# Altium schematic symbol library altera.SCHLIB: 68 symbols (part 1 of 6) (continued)
## EPF10K30*-FBGA256
designator IC?, comment EPF10K30   FLEX 10K family
MPN: EPF10K30EFC256-3N; MPN: EPF10K30AQC240-3N; OC_FARNELL: 1549394; OC_NEWARK: 51R8977; OC_FARNELL: 1549384; OC_NEWARK: 51R8956
footprint FBGA256
part A pins: A1 DATA0, A9 GCLK1, B1 /CE, B2 DCLK, B9 IN3, B15 TCK, B16 /CEO, C2 TDI, C15 CONF_DONE, C16 TDO, E8 IN2, L8 GCLK0, M9 IN0, N4 /CONFIG, P1 MSEL0, P15 TMS, R1 MSEL1, R8 IN1, R16 TRST, T16 /STATUS
part B pins: C1 IOA9, D2 IOA8, D3 IOA10, D15 IOA4, D16 IOA3, E1 IOA6, E13 IOA1, E14 IOA2, E15 IOA5, F3 IOA11, F4 IOA7, F13 IOA12
part C pins: E2 IOB10, F1 IOB8, F2 IOB7, F14 IOB1, F15 IOB4, F16 IOB11, G4 IOB6, G5 IOB9, G12 IOB2, G13 IOB3, H5 IOB5
part D pins: G1 IOC11, G2 IOC10, G14 IOC1, G15 IOC3, G16 IOC4, H2 IOC7, H3 IOC8, H4 IOC9, H12 IOC2, H13 IOC12, H14 IOC5, J5 IOC6
part E pins: H15 IOD1, J2 IOD9, J3 IOD10, J4 IOD11, J12 IOD2, J13 IOD3, J14 IOD4, J15 IOD6, J16 IOD5, K1 IOD8, K4 IOD12, K12 IOD7
part F pins: K2 IOE10, K5 IOE9, K13 IOE2, K15 IOE1, L1 IOE8, L3 IOE11, L13 IOE6, L14 IOE3, L15 IOE4, L16 IOE5, M2 IOE7
part G pins: M1 IOF10, M3 IOF11, M4 IOF9, M13 IOF2, M15 IOF1, N1 IOF6, N2 IOF8, N3 IOF7, N13 IOF12, N14 IOF3, N16 IOF4, P2 IOF5
part H pins: A2 IO22, A3 IO42, A4 IO52, B3 IO12, B4 IO43, C3 IO32, C4 IO62, D4 IO63, N5 IO71, P3 IO31, P4 IO51, R3 IO41, T1 IO11, T2 IO23, T3 IO21, T4 IO61
part I pins: A5 IO82, A6 IO123, B5 IO72, B6 IO112, C5 IO93, C6 IO122, D5 IO102, E4 IO113, N6 IO101, P5 IO81, P6 IO111, R4 IO73, R5 IO103, R6 IO121, T5 IO91, T6 IO124
part J pins: A7 IO143, A8 IO173, B7 IO144, B8 IO172, C7 IO153, D6 IO132, D7 IO152, D8 IO181, E7 IO162, M7 IO133, M8 IO161, N7 IO131, N8 IO171, P7 IO142, R7 IO151, T7 IO141
part K pins: A10 IO212, B10 IO223, C8 IO182, C9 IO192, C10 IO222, D9 IO204, E9 IO203, N9 IO201, N10 IO231, P8 IO183, P9 IO202, P10 IO213, R9 IO193, R10 IO211, T9 IO191, T10 IO221
part L pins: A11 IO242, A12 IO273, B11 IO252, B12 IO282, C11 IO264, C12 IO283, D10 IO233, D11 IO263, E10 IO232, M10 IO241, N11 IO261, P11 IO262, P12 IO281, R11 IO253, R12 IO271, T11 IO251
part M pins: A13 IO302, A14 IO342, B13 IO312, B14 IO343, C13 IO292, C14 IO332, D13 IO323, D14 IO322, P13 IO301, P14 IO293, R13 IO321, R14 IO331, T12 IO291, T13 IO311, T14 IO341, T15 IO351
part N pins: A15 IO352, A16 IO362, P16 IO363, R15 IO361
part O pins: E5 GND (power)
part P pins: E12 GND (power)
part Q pins: F6 GND (power)
part R pins: F11 GND (power)
part S pins: G7 GND (power)
part T pins: G9 GND (power)
part U pins: G10 GND (power)
part V pins: H8 GND (power)
part W pins: H9 GND (power)
part X pins: J8 GND (power)
part Y pins: J9 GND (power)
part Z pins: K7 GND (power)
part 27 pins: K10 GND (power)
part 28 pins: L6 GND (power)
part 29 pins: L11 GND (power)
part 30 pins: M5 GND (power)
part 31 pins: M12 GND (power)
part 32 pins: T8 GND (power)
part 33 pins: D1 NC
part 34 pins: E3 NC
part 35 pins: E16 NC
part 36 pins: G3 NC
part 37 pins: H1 NC
part 38 pins: H16 NC
part 39 pins: J1 NC
part 40 pins: K3 NC
part 41 pins: K14 NC
part 42 pins: K16 NC
part 43 pins: L2 NC
part 44 pins: L4 NC
part 45 pins: M14 NC
part 46 pins: M16 NC
part 47 pins: N15 NC
part 48 pins: E11 VCC (power)
part 49 pins: F5 VCC (power)
part 50 pins: F7 VCC (power)
part 51 pins: F9 VCC (power)
part 52 pins: F12 VCC (power)
part 53 pins: H6 VCC (power)
part 54 pins: H7 VCC (power)
part 55 pins: H10 VCC (power)
part 56 pins: J7 VCC (power)
part 57 pins: J10 VCC (power)
part 58 pins: J11 VCC (power)
part 59 pins: K9 VCC (power)
part 60 pins: L5 VCC (power)
part 61 pins: L7 VCC (power)
part 62 pins: L9 VCC (power)
part 63 pins: L12 VCC (power)
part 64 pins: M11 VCC (power)
part 65 pins: R2 VCC (power)
part 66 pins: D12 VCCIO (power)
part 67 pins: E6 VCCIO (power)
part 68 pins: F8 VCCIO (power)
part 69 pins: F10 VCCIO (power)
part 70 pins: G6 VCCIO (power)
part 71 pins: G8 VCCIO (power)
part 72 pins: G11 VCCIO (power)
part 73 pins: H11 VCCIO (power)
part 74 pins: J6 VCCIO (power)
part 75 pins: K6 VCCIO (power)
part 76 pins: K8 VCCIO (power)
part 77 pins: K11 VCCIO (power)
part 78 pins: L10 VCCIO (power)
part 79 pins: M6 VCCIO (power)
part 80 pins: N12 VCCIO (power)

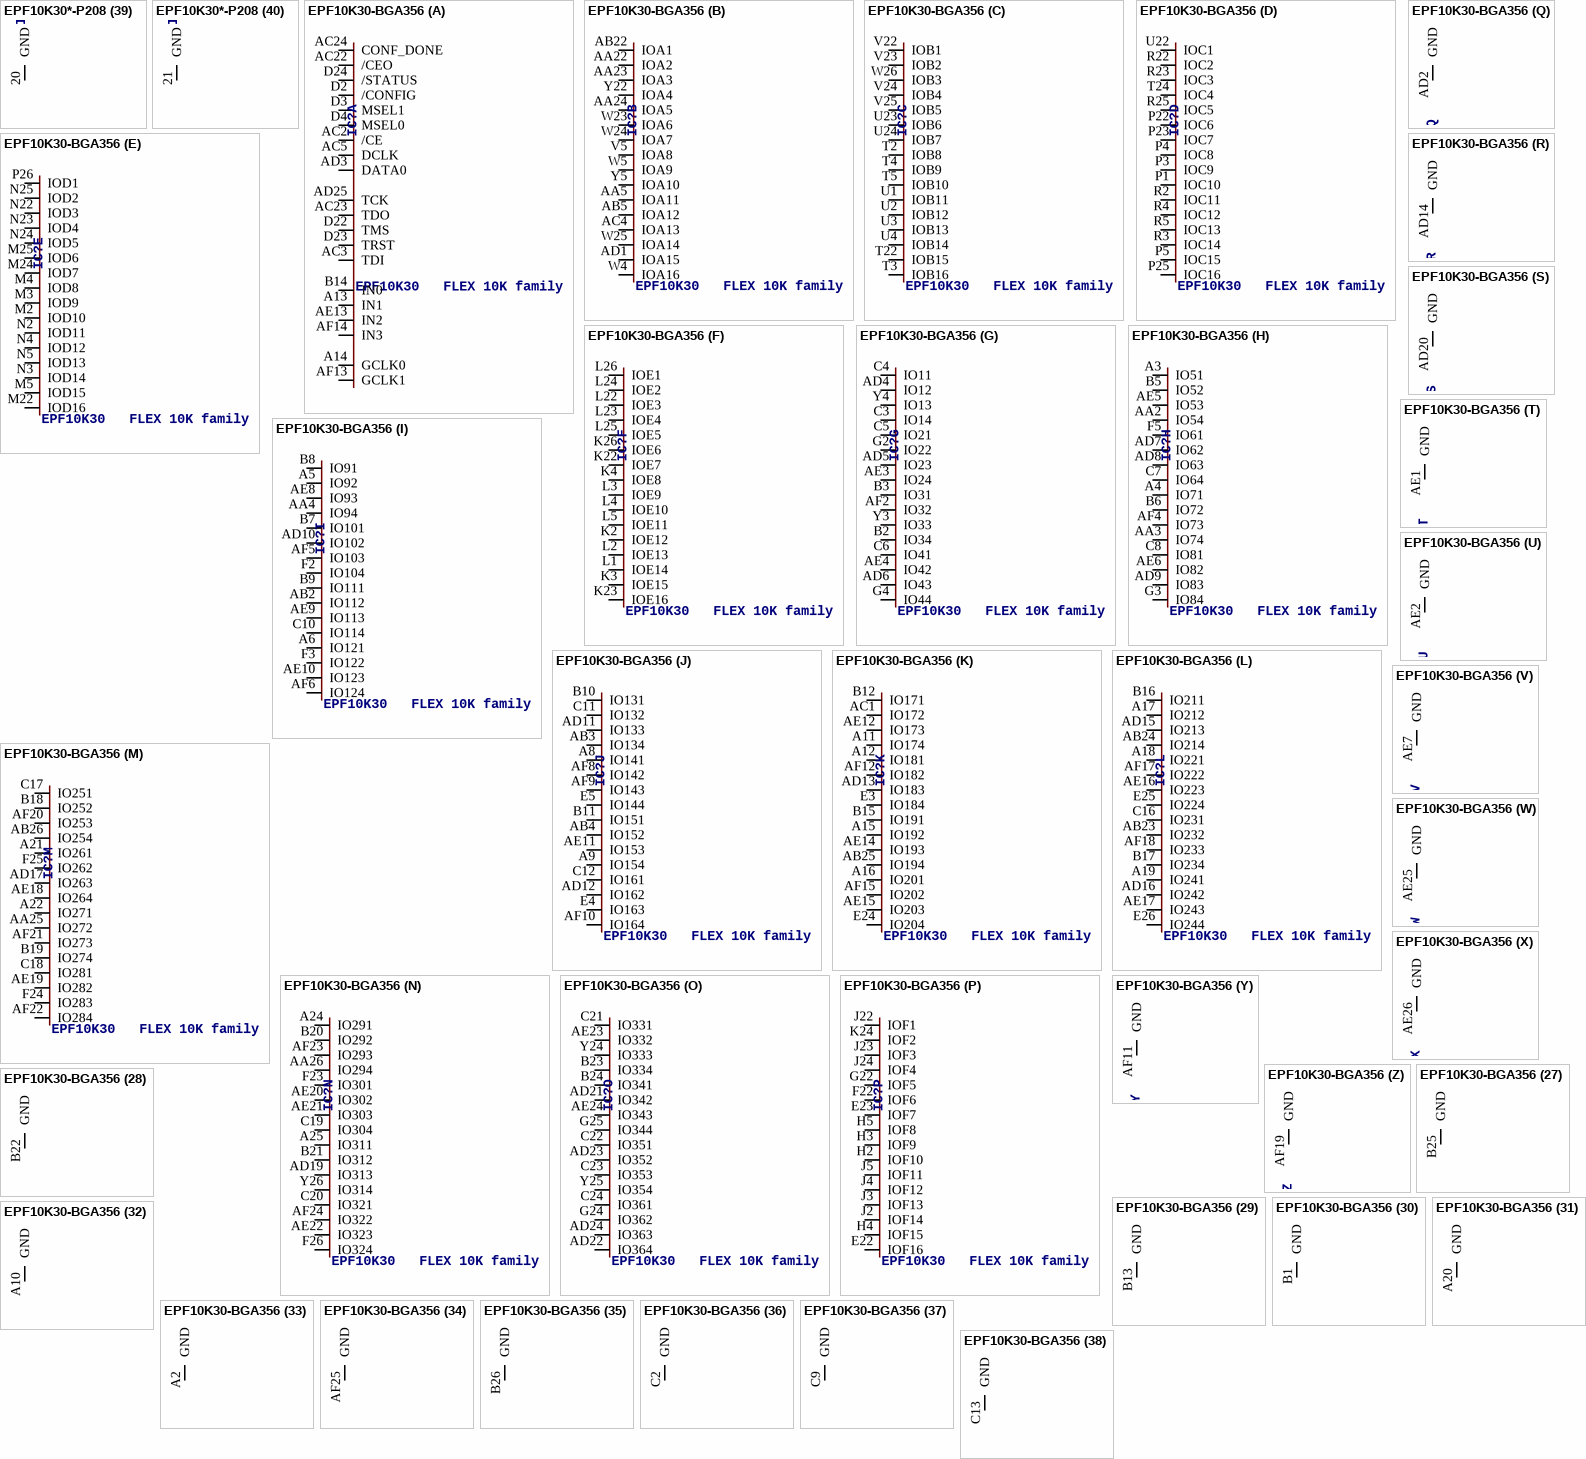
[diagram p5: symbols EPF10K30*-P208 to EPF10K30-BGA356]

## EPF10K30*-P208
designator IC?, comment EPF10K30   FLEX 10K family
MPN: EPF10K30EQC208-2N; MPN: EPF10K30AQI208-3N; OC_FARNELL: 1549382; OC_NEWARK: 51R8987; OC_FARNELL: unknown; OC_NEWARK: 51R8958
footprint PQFP208
part A pins: 1 TCK, 2 CONF_DONE, 3 /CEO, 4 TDO, 50 TMS, 51 TRST, 52 /STATUS, 78 IN0, 79 GCLK0, 80 IN1, 105 /CONFIG, 107 MSEL1, 108 MSEL0, 153 TDI, 154 /CE, 155 DCLK, 156 DATA0, 182 IN2, 183 GCLK1, 184 IN3
part B pins: 7 IOA1, 8 IOA2, 9 IOA3, 10 IOA4, 11 IOA5, 147 IOA6, 148 IOA7, 149 IOA8, 150 IOA9
part C pins: 12 IOB1, 13 IOB2, 14 IOB3, 15 IOB4, 139 IOB5, 140 IOB6, 141 IOB7, 142 IOB8, 143 IOB9, 144 IOB10
part D pins: 16 IOC1, 17 IOC2, 18 IOC3, 19 IOC4, 24 IOC5, 131 IOC6, 132 IOC7, 133 IOC8, 134 IOC9, 135 IOC10, 136 IOC11
part E pins: 25 IOD1, 26 IOD2, 27 IOD3, 28 IOD4, 29 IOD5, 30 IOD6, 31 IOD7, 125 IOD8, 126 IOD9, 127 IOD10, 128 IOD11
part F pins: 36 IOE1, 37 IOE2, 38 IOE3, 39 IOE4, 40 IOE5, 41 IOE6, 119 IOE7, 120 IOE8, 121 IOE9, 122 IOE10
part G pins: 44 IOF1, 45 IOF2, 46 IOF3, 47 IOF4, 111 IOF5, 112 IOF6, 113 IOF7, 114 IOF8, 115 IOF9, 116 IOF10
part H pins: 97 IO71, 99 IO61, 100 IO51, 101 IO41, 102 IO31, 103 IO21, 104 IO11, 157 IO12, 158 IO22, 159 IO32, 160 IO42, 161 IO43, 162 IO52, 163 IO62, 164 IO63, 166 IO72
part I pins: 87 IO141, 88 IO142, 89 IO131, 90 IO121, 92 IO111, 93 IO101, 94 IO91, 95 IO92, 96 IO81, 167 IO82, 168 IO93, 169 IO102, 170 IO112, 172 IO122, 173 IO132, 174 IO143
part J pins: 70 IO221, 71 IO211, 73 IO201, 74 IO202, 75 IO191, 83 IO171, 85 IO161, 86 IO151, 175 IO144, 176 IO152, 177 IO162, 179 IO172, 180 IO181, 186 IO192, 187 IO203, 189 IO212
part K pins: 61 IO291, 62 IO281, 63 IO271, 64 IO261, 65 IO262, 67 IO251, 68 IO241, 69 IO231, 190 IO222, 191 IO232, 192 IO242, 193 IO252, 195 IO263, 196 IO272, 197 IO282, 198 IO283
part L pins: 53 IO361, 54 IO351, 55 IO341, 56 IO331, 57 IO321, 58 IO311, 60 IO301, 199 IO292, 200 IO302, 202 IO312, 203 IO322, 204 IO332, 205 IO342, 206 IO343, 207 IO352, 208 IO362
part M pins: 6 VCC (power)
part N pins: 23 VCC (power)
part O pins: 35 VCC (power)
part P pins: 43 VCC (power)
part Q pins: 76 VCC (power)
part R pins: 77 VCC (power)
part S pins: 106 VCC (power)
part T pins: 109 VCC (power)
part U pins: 117 VCC (power)
part V pins: 137 VCC (power)
part W pins: 145 VCC (power)
part X pins: 181 VCC (power)
part Y pins: 5 VCCIO (power)
part Z pins: 22 VCCIO (power)
part 27 pins: 34 VCCIO (power)
part 28 pins: 42 VCCIO (power)
part 29 pins: 66 VCCIO (power)
part 30 pins: 84 VCCIO (power)
part 31 pins: 98 VCCIO (power)
part 32 pins: 110 VCCIO (power)
part 33 pins: 118 VCCIO (power)
part 34 pins: 138 VCCIO (power)
part 35 pins: 146 VCCIO (power)
part 36 pins: 165 VCCIO (power)
part 37 pins: 178 VCCIO (power)
part 38 pins: 194 VCCIO (power)
part 39 pins: 20 GND (power)
part 40 pins: 21 GND (power)
part 41 pins: 32 GND (power)
part 42 pins: 33 GND (power)
part 43 pins: 48 GND (power)
part 44 pins: 49 GND (power)
part 45 pins: 59 GND (power)
part 46 pins: 72 GND (power)
part 47 pins: 81 GND (power)
part 48 pins: 82 GND (power)
part 49 pins: 91 GND (power)
part 50 pins: 123 GND (power)
part 51 pins: 124 GND (power)
part 52 pins: 129 GND (power)
part 53 pins: 130 GND (power)
part 54 pins: 151 GND (power)
part 55 pins: 152 GND (power)
part 56 pins: 171 GND (power)
part 57 pins: 185 GND (power)
part 58 pins: 188 GND (power)
part 59 pins: 201 GND (power)

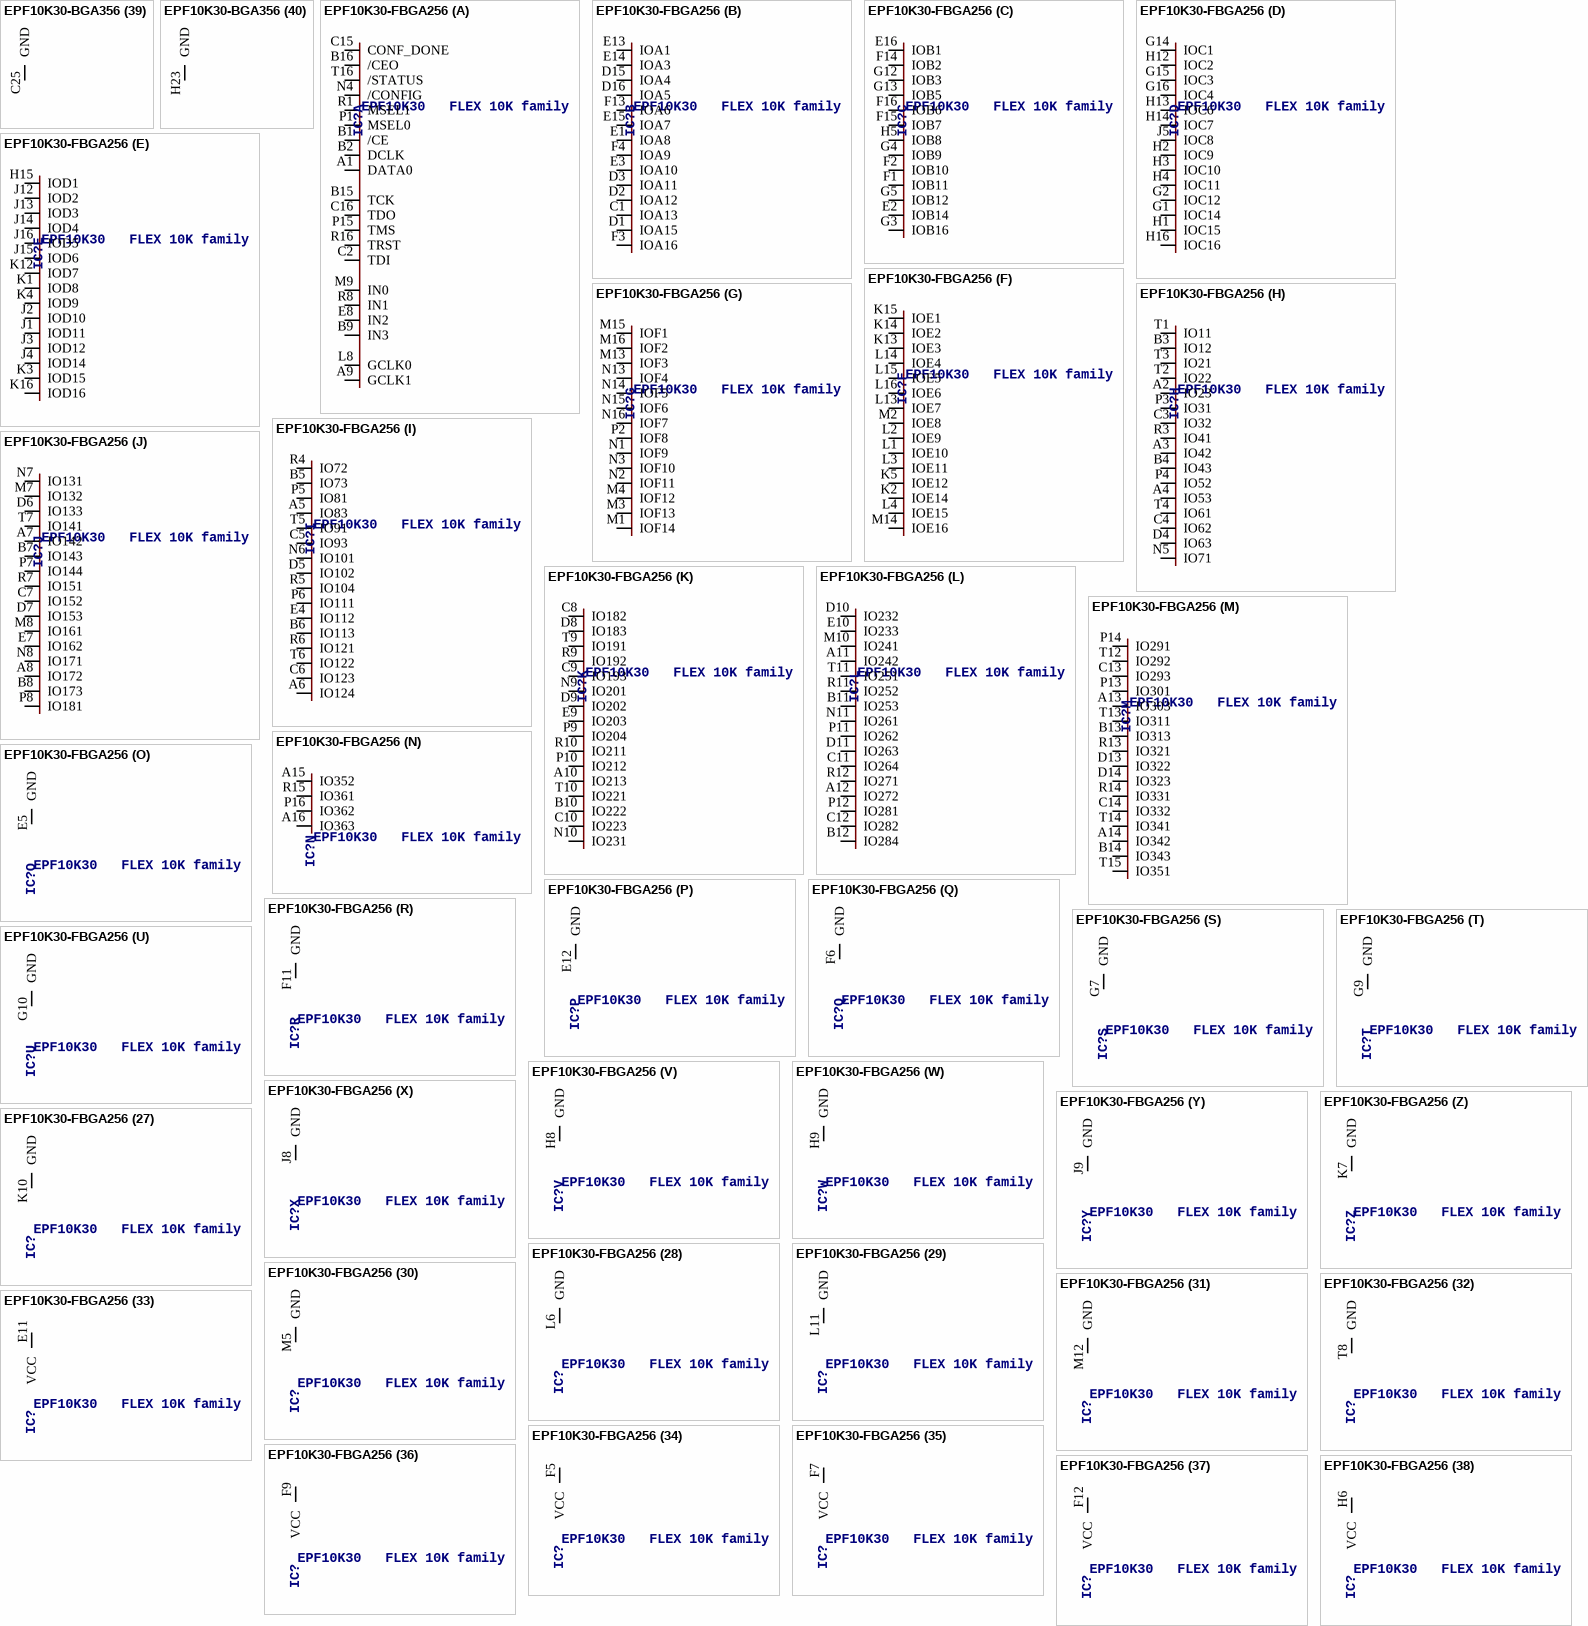
[diagram p6: symbols EPF10K30-BGA356 to EPF10K30-FBGA256]

## EPF10K30-BGA356
designator IC?, comment EPF10K30   FLEX 10K family
MPN: EPF10K30ABC356-2; OC_FARNELL: unknown; OC_NEWARK: 51R8936
footprint BGA356
part A pins: A13 IN1, A14 GCLK0, AC2 /CE, AC3 TDI, AC5 DCLK, AC22 /CEO, AC23 TDO, AC24 CONF_DONE, AD3 DATA0, AD25 TCK, AE13 IN2, AF13 GCLK1, AF14 IN3, B14 IN0, D2 /CONFIG, D3 MSEL1, D4 MSEL0, D22 TMS, D23 TRST, D24 /STATUS
part B pins: AA5 IOA11, AA22 IOA2, AA23 IOA3, AA24 IOA5, AB5 IOA12, AB22 IOA1, AC4 IOA13, AD1 IOA15, V5 IOA8, W4 IOA16, W5 IOA9, W23 IOA6, W24 IOA7, W25 IOA14, Y5 IOA10, Y22 IOA4
part C pins: T2 IOB8, T3 IOB16, T4 IOB9, T5 IOB10, T22 IOB15, U1 IOB11, U2 IOB12, U3 IOB13, U4 IOB14, U23 IOB6, U24 IOB7, V22 IOB1, V23 IOB2, V24 IOB4, V25 IOB5, W26 IOB3
part D pins: P1 IOC10, P3 IOC9, P4 IOC8, P5 IOC15, P22 IOC6, P23 IOC7, P25 IOC16, R2 IOC11, R3 IOC14, R4 IOC12, R5 IOC13, R22 IOC2, R23 IOC3, R25 IOC5, T24 IOC4, U22 IOC1
part E pins: M2 IOD10, M3 IOD9, M4 IOD8, M5 IOD15, M22 IOD16, M24 IOD7, M25 IOD6, N2 IOD11, N3 IOD14, N4 IOD12, N5 IOD13, N22 IOD3, N23 IOD4, N24 IOD5, N25 IOD2, P26 IOD1
part F pins: K2 IOE12, K3 IOE15, K4 IOE8, K22 IOE7, K23 IOE16, K26 IOE6, L1 IOE14, L2 IOE13, L3 IOE9, L4 IOE10, L5 IOE11, L22 IOE3, L23 IOE4, L24 IOE2, L25 IOE5, L26 IOE1
part G pins: AD4 IO12, AD5 IO23, AD6 IO43, AE3 IO24, AE4 IO42, AF2 IO32, B2 IO34, B3 IO31, C3 IO14, C4 IO11, C5 IO21, C6 IO41, G2 IO22, G4 IO44, Y3 IO33, Y4 IO13
part H pins: A3 IO51, A4 IO71, AA2 IO54, AA3 IO74, AD7 IO62, AD8 IO63, AD9 IO83, AE5 IO53, AE6 IO82, AF4 IO73, B5 IO52, B6 IO72, C7 IO64, C8 IO81, F5 IO61, G3 IO84
part I pins: A5 IO92, A6 IO121, AA4 IO94, AB2 IO112, AD10 IO102, AE8 IO93, AE9 IO113, AE10 IO123, AF5 IO103, AF6 IO124, B7 IO101, B8 IO91, B9 IO111, C10 IO114, F2 IO104, F3 IO122
part J pins: A8 IO141, A9 IO154, AB3 IO134, AB4 IO152, AD11 IO133, AD12 IO162, AE11 IO153, AF8 IO142, AF9 IO143, AF10 IO164, B10 IO131, B11 IO151, C11 IO132, C12 IO161, E4 IO163, E5 IO144
part K pins: A11 IO174, A12 IO181, A15 IO192, A16 IO201, AB25 IO194, AC1 IO172, AD13 IO183, AE12 IO173, AE14 IO193, AE15 IO203, AF12 IO182, AF15 IO202, B12 IO171, B15 IO191, E3 IO184, E24 IO204
part L pins: A17 IO212, A18 IO221, A19 IO241, AB23 IO232, AB24 IO214, AD15 IO213, AD16 IO242, AE16 IO223, AE17 IO243, AF17 IO222, AF18 IO233, B16 IO211, B17 IO234, C16 IO231, E25 IO224, E26 IO244
part M pins: A21 IO261, A22 IO271, AA25 IO272, AB26 IO254, AD17 IO263, AE18 IO264, AE19 IO282, AF20 IO253, AF21 IO273, AF22 IO284, B18 IO252, B19 IO274, C17 IO251, C18 IO281, F24 IO283, F25 IO262
part N pins: A24 IO291, A25 IO311, AA26 IO294, AD19 IO313, AE20 IO302, AE21 IO303, AE22 IO323, AF23 IO293, AF24 IO322, B20 IO292, B21 IO312, C19 IO304, C20 IO321, F23 IO301, F26 IO324, Y26 IO314
part O pins: AD21 IO342, AD22 IO364, AD23 IO352, AD24 IO363, AE23 IO332, AE24 IO343, B23 IO334, B24 IO341, C21 IO331, C22 IO351, C23 IO353, C24 IO361, G24 IO362, G25 IO344, Y24 IO333, Y25 IO354
part P pins: E22 IOF16, E23 IOF7, F22 IOF6, G22 IOF5, H2 IOF10, H3 IOF9, H4 IOF15, H5 IOF8, J2 IOF14, J3 IOF13, J4 IOF12, J5 IOF11, J22 IOF1, J23 IOF3, J24 IOF4, K24 IOF2
part Q pins: AD2 GND (power)
part R pins: AD14 GND (power)
part S pins: AD20 GND (power)
part T pins: AE1 GND (power)
part U pins: AE2 GND (power)
part V pins: AE7 GND (power)
part W pins: AE25 GND (power)
part X pins: AE26 GND (power)
part Y pins: AF11 GND (power)
part Z pins: AF19 GND (power)
part 27 pins: B25 GND (power)
part 28 pins: B22 GND (power)
part 29 pins: B13 GND (power)
part 30 pins: B1 GND (power)
part 31 pins: A20 GND (power)
part 32 pins: A10 GND (power)
part 33 pins: A2 GND (power)
part 34 pins: AF25 GND (power)
part 35 pins: B26 GND (power)
part 36 pins: C2 GND (power)
part 37 pins: C9 GND (power)
part 38 pins: C13 GND (power)
part 39 pins: C25 GND (power)
part 40 pins: H23 GND (power)
part 41 pins: J26 GND (power)
part 42 pins: K1 GND (power)
part 43 pins: M1 GND (power)
part 44 pins: N26 GND (power)
part 45 pins: R1 GND (power)
part 46 pins: R26 GND (power)
part 47 pins: T1 GND (power)
part 48 pins: U26 GND (power)
part 49 pins: W1 GND (power)
part 50 pins: AC26 NC
part 51 pins: C1 NC
part 52 pins: D1 NC
part 53 pins: D26 NC
part 54 pins: E1 NC
part 55 pins: E2 NC
part 56 pins: G1 NC
part 57 pins: G5 NC
part 58 pins: G23 NC
part 59 pins: G26 NC
part 60 pins: H1 NC
part 61 pins: H25 NC
part 62 pins: H26 NC
part 63 pins: J25 NC
part 64 pins: K25 NC
part 65 pins: P24 NC
part 66 pins: R24 NC
part 67 pins: T23 NC
part 68 pins: U25 NC
part 69 pins: V1 NC
part 70 pins: V3 NC
part 71 pins: V4 NC
part 72 pins: V26 NC
part 73 pins: W2 NC
part 74 pins: W3 NC
part 75 pins: Y1 NC
part 76 pins: Y2 NC
part 77 pins: Y23 NC
part 78 pins: AA1 VCC (power)
part 79 pins: AD26 VCC (power)
part 80 pins: AF1 VCC (power)
part 81 pins: AF26 VCC (power)
part 82 pins: A1 VCC (power)
part 83 pins: A26 VCC (power)
part 84 pins: C14 VCC (power)
part 85 pins: C26 VCC (power)
part 86 pins: D5 VCC (power)
part 87 pins: F1 VCC (power)
part 88 pins: H22 VCC (power)
part 89 pins: J1 VCC (power)
part 90 pins: M26 VCC (power)
part 91 pins: N1 VCC (power)
part 92 pins: T26 VCC (power)
part 93 pins: U5 VCC (power)
part 94 pins: AB1 VCCIO (power)
part 95 pins: AC25 VCCIO (power)
part 96 pins: AD18 VCCIO (power)
part 97 pins: AF3 VCCIO (power)
part 98 pins: AF7 VCCIO (power)
part 99 pins: AF16 VCCIO (power)
part 100 pins: A7 VCCIO (power)
part 101 pins: A23 VCCIO (power)
part 102 pins: B4 VCCIO (power)
part 103 pins: C15 VCCIO (power)
part 104 pins: D25 VCCIO (power)
part 105 pins: F4 VCCIO (power)
part 106 pins: H24 VCCIO (power)
part 107 pins: K5 VCCIO (power)
part 108 pins: M23 VCCIO (power)
part 109 pins: P2 VCCIO (power)
part 110 pins: T25 VCCIO (power)
part 111 pins: V2 VCCIO (power)
part 112 pins: W22 VCCIO (power)

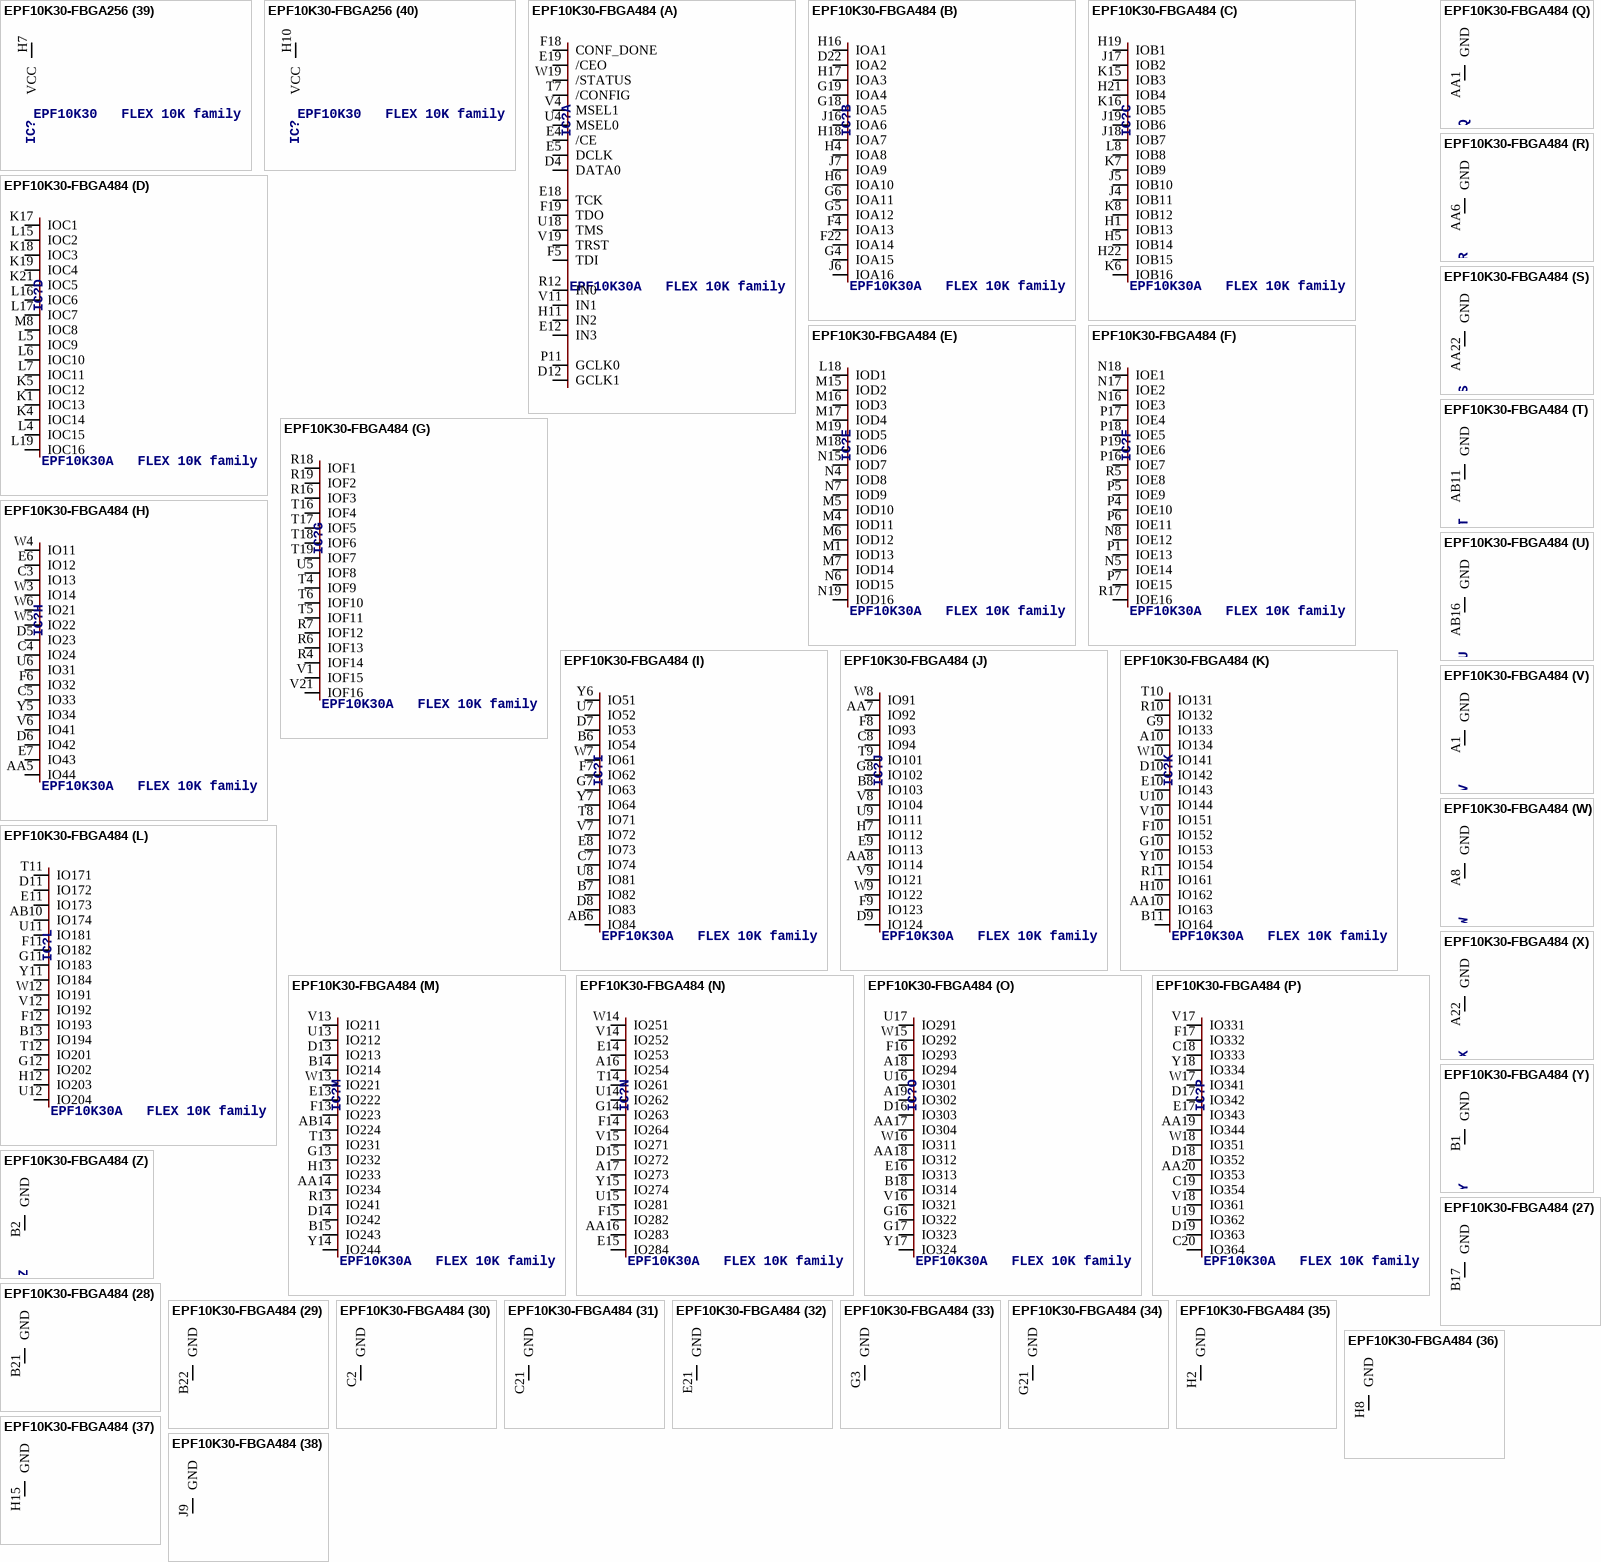
[diagram p7: symbols EPF10K30-FBGA256 to EPF10K30-FBGA484]

## EPF10K30-FBGA256
designator IC?, comment EPF10K30   FLEX 10K family
MPN: EPF10K30EFC256-3N; OC_FARNELL: 1549394; OC_NEWARK: 51R8977
footprint FBGA256
part A pins: A1 DATA0, A9 GCLK1, B1 /CE, B2 DCLK, B9 IN3, B15 TCK, B16 /CEO, C2 TDI, C15 CONF_DONE, C16 TDO, E8 IN2, L8 GCLK0, M9 IN0, N4 /CONFIG, P1 MSEL0, P15 TMS, R1 MSEL1, R8 IN1, R16 TRST, T16 /STATUS
part B pins: C1 IOA13, D1 IOA15, D2 IOA12, D3 IOA11, D15 IOA4, D16 IOA5, E1 IOA8, E3 IOA10, E13 IOA1, E14 IOA3, E15 IOA7, F3 IOA16, F4 IOA9, F13 IOA6
part C pins: E2 IOB14, E16 IOB1, F1 IOB11, F2 IOB10, F14 IOB2, F15 IOB7, F16 IOB6, G3 IOB16, G4 IOB9, G5 IOB12, G12 IOB3, G13 IOB5, H5 IOB8
part D pins: G1 IOC14, G2 IOC12, G14 IOC1, G15 IOC3, G16 IOC4, H1 IOC15, H2 IOC9, H3 IOC10, H4 IOC11, H12 IOC2, H13 IOC6, H14 IOC7, H16 IOC16, J5 IOC8
part E pins: H15 IOD1, J1 IOD11, J2 IOD10, J3 IOD12, J4 IOD14, J12 IOD2, J13 IOD3, J14 IOD4, J15 IOD6, J16 IOD5, K1 IOD8, K3 IOD15, K4 IOD9, K12 IOD7, K16 IOD16
part F pins: K2 IOE14, K5 IOE12, K13 IOE3, K14 IOE2, K15 IOE1, L1 IOE10, L2 IOE9, L3 IOE11, L4 IOE15, L13 IOE7, L14 IOE4, L15 IOE5, L16 IOE6, M2 IOE8, M14 IOE16
part G pins: M1 IOF14, M3 IOF13, M4 IOF12, M13 IOF3, M15 IOF1, M16 IOF2, N1 IOF9, N2 IOF11, N3 IOF10, N13 IOF4, N14 IOF5, N15 IOF6, N16 IOF7, P2 IOF8
part H pins: A2 IO23, A3 IO42, A4 IO53, B3 IO12, B4 IO43, C3 IO32, C4 IO62, D4 IO63, N5 IO71, P3 IO31, P4 IO52, R3 IO41, T1 IO11, T2 IO22, T3 IO21, T4 IO61
part I pins: A5 IO83, A6 IO124, B5 IO73, B6 IO113, C5 IO93, C6 IO123, D5 IO102, E4 IO112, N6 IO101, P5 IO81, P6 IO111, R4 IO72, R5 IO104, R6 IO121, T5 IO91, T6 IO122
part J pins: A7 IO142, A8 IO172, B7 IO143, B8 IO173, C7 IO152, D6 IO133, D7 IO153, E7 IO162, M7 IO132, M8 IO161, N7 IO131, N8 IO171, P7 IO144, P8 IO181, R7 IO151, T7 IO141
part K pins: A10 IO213, B10 IO222, C8 IO182, C9 IO193, C10 IO223, D8 IO183, D9 IO202, E9 IO203, N9 IO201, N10 IO231, P9 IO204, P10 IO212, R9 IO192, R10 IO211, T9 IO191, T10 IO221
part L pins: A11 IO242, A12 IO272, B11 IO253, B12 IO284, C11 IO264, C12 IO282, D10 IO232, D11 IO263, E10 IO233, M10 IO241, N11 IO261, P11 IO262, P12 IO281, R11 IO252, R12 IO271, T11 IO251
part M pins: A13 IO303, A14 IO342, B13 IO313, B14 IO343, C13 IO293, C14 IO332, D13 IO322, D14 IO323, P13 IO301, P14 IO291, R13 IO321, R14 IO331, T12 IO292, T13 IO311, T14 IO341, T15 IO351
part N pins: A15 IO352, A16 IO363, P16 IO362, R15 IO361
part O pins: E5 GND (power)
part P pins: E12 GND (power)
part Q pins: F6 GND (power)
part R pins: F11 GND (power)
part S pins: G7 GND (power)
part T pins: G9 GND (power)
part U pins: G10 GND (power)
part V pins: H8 GND (power)
part W pins: H9 GND (power)
part X pins: J8 GND (power)
part Y pins: J9 GND (power)
part Z pins: K7 GND (power)
part 27 pins: K10 GND (power)
part 28 pins: L6 GND (power)
part 29 pins: L11 GND (power)
part 30 pins: M5 GND (power)
part 31 pins: M12 GND (power)
part 32 pins: T8 GND (power)
part 33 pins: E11 VCC (power)
part 34 pins: F5 VCC (power)
part 35 pins: F7 VCC (power)
part 36 pins: F9 VCC (power)
part 37 pins: F12 VCC (power)
part 38 pins: H6 VCC (power)
part 39 pins: H7 VCC (power)
part 40 pins: H10 VCC (power)
part 41 pins: J7 VCC (power)
part 42 pins: J10 VCC (power)
part 43 pins: J11 VCC (power)
part 44 pins: K9 VCC (power)
part 45 pins: L5 VCC (power)
part 46 pins: L7 VCC (power)
part 47 pins: L9 VCC (power)
part 48 pins: L12 VCC (power)
part 49 pins: M11 VCC (power)
part 50 pins: R2 VCC (power)
part 51 pins: D12 VCCIO (power)
part 52 pins: E6 VCCIO (power)
part 53 pins: F8 VCCIO (power)
part 54 pins: F10 VCCIO (power)
part 55 pins: G6 VCCIO (power)
part 56 pins: G8 VCCIO (power)
part 57 pins: G11 VCCIO (power)
part 58 pins: H11 VCCIO (power)
part 59 pins: J6 VCCIO (power)
part 60 pins: K6 VCCIO (power)
part 61 pins: K8 VCCIO (power)
part 62 pins: K11 VCCIO (power)
part 63 pins: L10 VCCIO (power)
part 64 pins: M6 VCCIO (power)
part 65 pins: N12 VCCIO (power)
